# Altium footprint library 3.22-杂项.PcbLib: 985 footprints (part 1 of 64)
Each footprint in its own frame and in the unit in brackets; x right, y up, seen from the top. Pads: shape width x height; smd on the part's side, far side on the other; paste and mask are expansions set on the pad; w line width, h text height; cw(c..) or ccw(c..) is an arc to the next point about the centre after c.
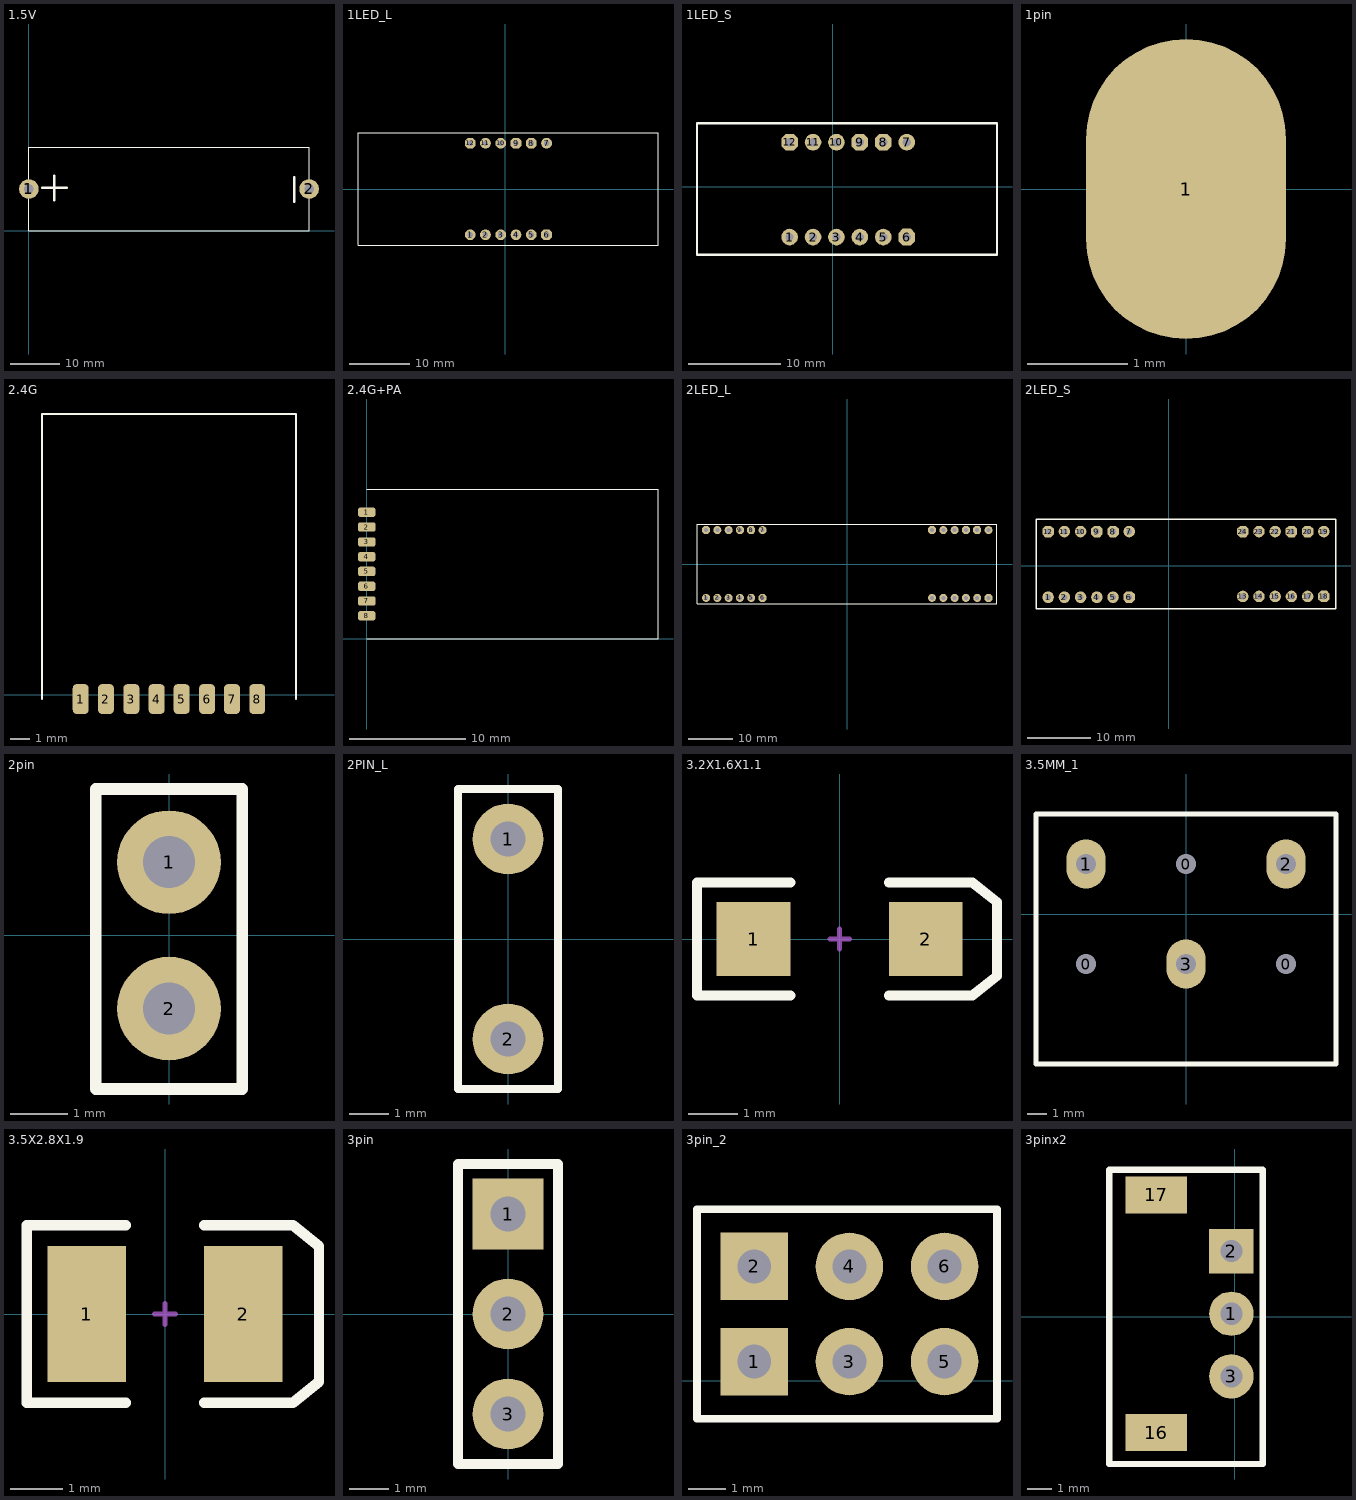
[diagram p0: the footprints below, top view; thin cyan lines are the x and y axes]

## 1.5V [mm]
pads (2):
  round 4 hole 2: 1(0,8.5) 2(57.1,8.5)
Top Overlay:
  lines w0.1: 0,0 0,17 57.099,17 57.099,0 0,0
  lines w0.5: 2.709,8.75 7.709,8.75 ; 5.207,6.248 5.207,11.248 ; 54.064,5.944 54.064,10.944

## 1LED_L [mm]
pads (12):
  round 1.8 hole 0.9: 1(-5.842,-7.62) 2(-3.302,-7.62) 3(-0.762,-7.62) 4(1.778,-7.62) 5(4.318,-7.62) 7(6.858,7.62) 10(-0.762,7.62) 11(-3.302,7.62)
  oct 1.8x1.8 hole 0.9: 6(6.858,-7.62) 8(4.318,7.62) 9(1.778,7.62) 12(-5.842,7.62)
Top Overlay:
  lines w0.127: -24.511,-9.398 25.4,-9.398 25.4,9.398 -24.511,9.398 -24.511,-9.398

## 1LED_S [mm]
pads (12):
  round 1.8 hole 0.9: 1(-4.699,-5.461) 2(-2.159,-5.461) 3(0.381,-5.461) 4(2.921,-5.461) 5(5.461,-5.461) 7(8.001,4.826) 10(0.381,4.826) 11(-2.159,4.826)
  oct 1.8x1.8 hole 0.9: 6(8.001,-5.461) 8(5.461,4.826) 9(2.921,4.826) 12(-4.699,4.826)
Top Overlay:
  lines w0.254: -6.604,6.858 17.78,6.858 17.78,-7.366 -14.732,-7.366 -14.732,6.858 -6.096,6.858

## 1pin [mm]
pads (1):
  oval 2x3 smd: 1(0,0)

## 2.4G [mil]
pads (8):
  rrect50% 31.5x59.06 smd: 1(-566,-9) 2(-516,-9) 3(-465.5,-9) 4(-415.5,-9) 5(-366,-9) 6(-315.5,-9) 7(-266,-9) 8(-216,-9)
Top Overlay:
  lines w3.94: -642.94,-9 -642.94,556 -139,556 -139,-9
3D body: height 78.74, standoff 7.87, extent -643,-9 -139,544

## 2.4G+PA [mm] "欢迎光临https://shop463601444.taobao.com 掌柜ID：黄晶宝石"
pads (8):
  rrect50% 1.5x0.8 smd: 1(0,10.846) 2(0,9.576) 3(0,8.293) 4(0,7.023) 5(0,5.766) 6(0,4.483) 7(0,3.226) 8(0,1.956)
Top Overlay:
  lines w0.1: 0,0 25,0 25,12.8 0,12.8
3D body: height 2, standoff 0.2, extent 0,0 24.994,12.802

## 2LED_L [mm]
pads (24):
  round 1.8 hole 0.9: 1(-31.75,-7.62) 2(-29.21,-7.62) 3(-26.67,-7.62) 4(-24.13,-7.62) 5(-21.59,-7.62) 7(-19.05,7.62) 10(-26.67,7.62) 11(-29.21,7.62) 13(19.05,-7.62) 14(21.59,-7.62) 15(24.13,-7.62) 16(26.67,-7.62) 17(29.21,-7.62) 19(31.75,7.62) 22(24.13,7.62) 23(21.59,7.62)
  oct 1.8x1.8 hole 0.9: 6(-19.05,-7.62) 8(-21.59,7.62) 9(-24.13,7.62) 12(-31.75,7.62) 18(31.75,-7.62) 20(29.21,7.62) 21(26.67,7.62) 24(19.05,7.62)
Top Overlay:
  lines w0.203: -33.782,-8.89 -33.782,8.89 33.655,8.89 33.655,-8.89 -33.782,-8.89

## 2LED_S [mm]
height 12.7
pads (24):
  round 1.8 hole 0.9: 1(-18.923,-4.953) 2(-16.383,-4.953) 3(-13.843,-4.953) 4(-11.303,-4.953) 5(-8.763,-4.953) 7(-6.223,5.334) 10(-13.843,5.334) 11(-16.383,5.334) 13(11.557,-4.826) 14(14.097,-4.826) 15(16.637,-4.826) 16(19.177,-4.826) 17(21.717,-4.826) 19(24.257,5.334) 22(16.637,5.334) 23(14.097,5.334)
  oct 1.8x1.8 hole 0.9: 6(-6.223,-4.953) 8(-8.763,5.334) 9(-11.303,5.334) 12(-18.923,5.334) 18(24.257,-4.826) 20(21.717,5.334) 21(19.177,5.334) 24(11.557,5.334)
Top Overlay:
  lines w0.203: -20.193,7.239 26.162,7.239 26.162,-6.731 9.652,-6.731 -20.828,-6.731 -20.828,7.239 -20.32,7.239 -20.066,7.239

## 2pin [mm]
height 10
pads (2):
  round 1.8 hole 0.9: 1(0,1.27) 2(0,-1.27)
Top Overlay:
  lines w0.203: -1.27,-2.667 -1.27,2.54 1.27,2.54 1.27,-2.667 -1.27,-2.667

## 2PIN_L [mm]
pads (2):
  round 1.8 hole 0.9: 1(0,2.54) 2(0,-2.54)
Top Overlay:
  lines w0.203: -1.27,-3.81 -1.27,3.81 1.27,3.81 1.27,-3.81 -1.27,-3.81

## 3.2X1.6X1.1 [mm] "SMT LED; 2 Flat Leads"
height 1.2
pads (2):
  rect 1.5x1.5 smd: 1(-1.75,0) 2(1.75,0)
Top Overlay:
  lines w0.2: -1,-1.15 -2.9,-1.15 -2.9,1.15 -1,1.15 ; 1,-1.15 2.7,-1.15 3.2,-0.75 3.2,0.75 2.7,1.15 1,1.15
Mechanical 1:
  lines w0.1: -0.2,0 0.2,0 ; 0,-0.2 0,0.2

## 3.5MM_1 [mm]
pads (6):
  round 1 hole 1: 0(-5.08,-2.54) 0(0,2.54) 0(5.08,-2.54)
  oval 2x2.5 hole 1: 1(-5.08,2.54) 2(5.08,2.54) 3(0,-2.54)
Top Overlay:
  lines w0.254: -7.62,-7.62 7.62,-7.62 7.62,5.08 -7.62,5.08 -7.62,-7.62

## 3.5X2.8X1.9 [mm] "SM LED; 2 C-Bend Leads; Body 3.5 x 2.8 x 1.9 mm, inc leads (LxWxH typ)"
height 1.9
pads (2):
  rect 1.5x2.6 smd: 1(-1.5,0) 2(1.5,0)
Top Overlay:
  lines w0.2: -0.75,-1.7 -2.65,-1.7 -2.65,1.7 -0.75,1.7 ; 0.75,-1.7 2.45,-1.7 2.95,-1.3 2.95,1.3 2.45,1.7 0.75,1.7
Mechanical 1:
  lines w0.1: -0.2,0 0.2,0 ; 0,-0.2 0,0.2

## 3pin [mm]
pads (3):
  rect 1.8x1.8 hole 0.9: 1(0,2.54)
  round 1.8 hole 0.9: 2(0,0) 3(0,-2.54)
Top Overlay:
  lines w0.254: -1.27,-3.81 -1.27,3.81 1.27,3.81 1.27,-3.81 -1.27,-3.81

## 3pin_2 [mm]
pads (6):
  rect 1.8x1.8 hole 0.9: 1(5.715,0.508) 2(5.715,3.048)
  round 1.8 hole 0.9: 3(8.255,0.508) 4(8.255,3.048) 5(10.795,0.508) 6(10.795,3.048)
Top Overlay:
  lines w0.203: 4.191,-1.016 4.191,4.572 12.192,4.572 12.192,-1.016 4.191,-1.016

## 3pinx2 [mm]
pads (5):
  round 1.8 hole 0.9: 1(-0.127,0.127) 3(-0.127,-2.413)
  rect 1.8x1.8 hole 0.9: 2(-0.127,2.667)
  rect 2.5x1.5 all layers, no hole: 16(-3.175,-4.699) 17(-3.175,4.953)
Top Overlay:
  lines w0.254: -5.08,-5.969 1.143,-5.969 1.143,5.969 -5.08,5.969 -5.08,-5.969